# Altium footprint library LimeMicroAltiumLib_pcbLib.PcbLib: 223 footprints (part 14 of 15)
Each footprint in its own frame and in the unit in brackets; x right, y up, seen from the top. Pads: shape width x height; smd on the part's side, far side on the other; paste and mask are expansions set on the pad; w line width, h text height; cw(c..) or ccw(c..) is an arc to the next point about the centre after c.
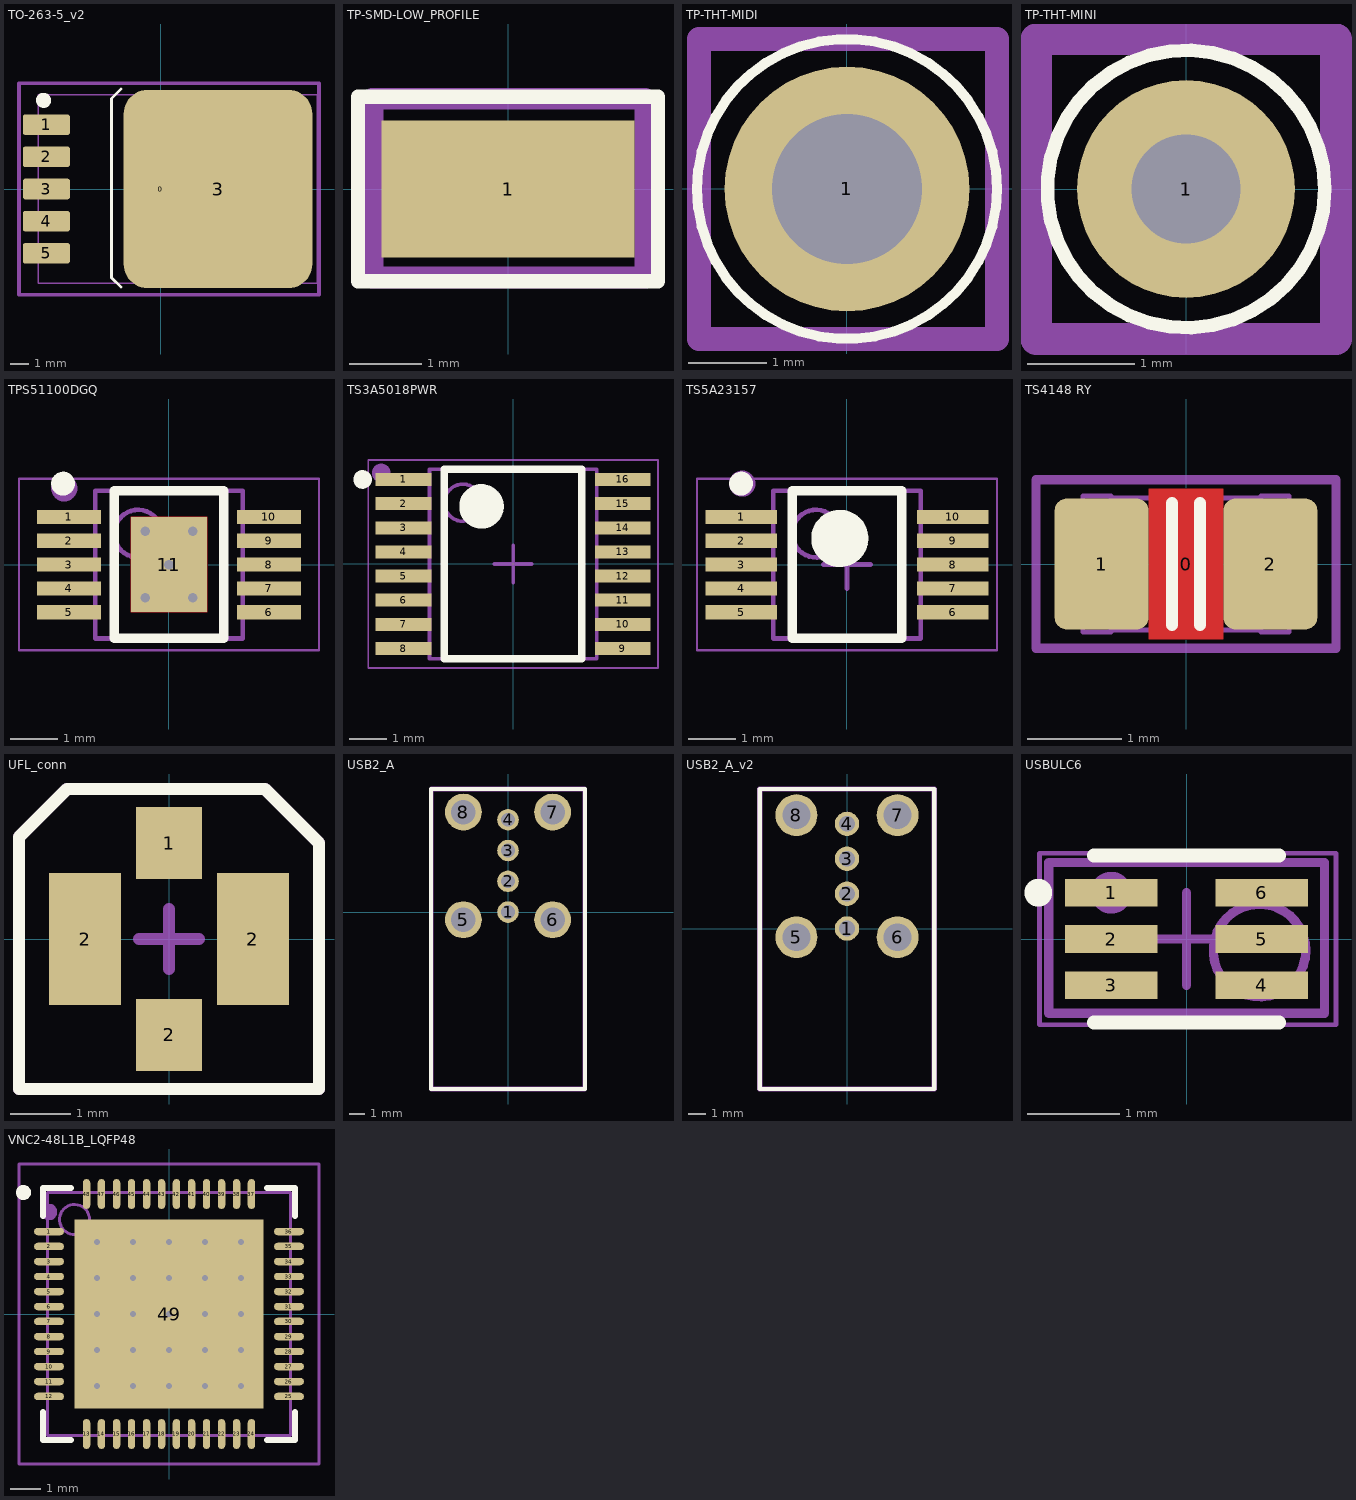
[diagram p13: the footprints below, top view; thin cyan lines are the x and y axes]

## TO-263-5_v2 [mm] "D-PAK/TO-263-5; 5 Leads; Body 14.4 (inc. leads) x 10.4 mm (LxW max)"
height 4.65
pads (7):
  round 0.5 on Mech15: 0(0,0)
  rrect25% 2.5x1.1 smd: 1(-6.05,3.41) 2(-6.05,1.705) 3(-6.05,0) 4(-6.05,-1.705) 5(-6.05,-3.41)
  rrect25% 10x10.5 smd: 3(3.05,0)
Top Overlay:
  circle w0.4: c-6.2,4.7 r0.2
  lines w0.15: -2.1,-5.2 -2.6,-4.7 -2.6,4.8 -2.1,5.3
Mechanical 13:
  lines w0.076: -6.49,-5 8.3,-5 8.3,5 -6.49,5 -6.49,-5
Mechanical 15:
  circle w0.4: c-6.2,3.4 r0.2
  lines w0.2: -7.5,-5.6 8.4,-5.6 8.4,5.6 -7.5,5.6 -7.5,-5.6
  text ".designator" at 0,0 h0.9
3D body "TO-263-5.stp": height 4.56, standoff 0, extent -6.727,-5.08 7.288,5.08

## TP-SMD-LOW_PROFILE [mm] "SMD test point loop"
height 4.6
pads (1):
  rect 3.5x1.9 smd: 1(0,0)
Top Overlay:
  lines w0.2: -2.075,-1.275 -2.075,1.275 2.075,1.275 2.075,-1.275 -2.075,-1.275
Mechanical 13:
  circle w0.076: c0,0 r0.76
Mechanical 15:
  lines w0.3: -1.875,-1.225 -1.875,1.25 1.9,1.25 1.9,-1.225 -1.875,-1.225
  text ".Designator" at 0,0 h0.7
3D body "RCW (1206).stp": height 2, standoff 0, extent -1.6,-0.8 1.6,0.8

## TP-THT-MIDI [mm] "Thru-hole test point loop"
height 4.6
pads (1):
  round 3.1 hole 1.9: 1(0,0)
Top Overlay:
  circle w0.127: c0,0 r1.9
Mechanical 13:
  circle w0.076: c0,0 r0.76
Mechanical 15:
  lines w0.3: -1.875,-1.9 1.9,-1.9 1.9,1.9 -1.875,1.9 -1.875,-1.9
  text ".Designator" at 0,0 h0.7
3D body "TestPoint_Multi.stp": height 8.09, standoff -3.21, extent -1.597,-1.6 1.597,1.587

## TP-THT-MINI [mil] "Thru-hole test point loop"
height 181.1
pads (1):
  round 80 / inner round 80 / far side round 90 hole 40: 1(0,0)
Top Overlay:
  circle w5: c0,0 r51
Mechanical 13:
  circle w3: c0,0 r29.94
Mechanical 15:
  lines w11.81: -55.12,-55.12 55.12,-55.12 55.12,55.12 -55.12,55.12 -55.12,-55.12
  text ".Designator" at 0,0 h27.56
3D body "TestPoint_Mini.stp": height 180.51, standoff -118.14, extent -48.82,-49.11 49.21,49.12

## TPS51100DGQ [mm] "TSSOP, 10-Leads, Body 3,00x3,00mm, Pitch 0,50mm, IPC Medium Density"
height 1.1
pads (11):
  rect 1.35x0.3 smd: 1(-2.1,1) 2(-2.1,0.5) 3(-2.1,0) 4(-2.1,-0.5) 5(-2.1,-1) 6(2.1,-1) 7(2.1,-0.5) 8(2.1,0) 9(2.1,0.5) 10(2.1,1)
  rect 1.6x2 smd: 11(0,0)
via -0.5,0.7 diameter 0.4 hole 0.2
via 0.5,0.7 diameter 0.4 hole 0.2
via 0.5,-0.7 diameter 0.4 hole 0.2
via -0.5,-0.7 diameter 0.4 hole 0.2
via 0,0 diameter 0.4 hole 0.2
Top Layer:
  region: -0.8,-1 0.8,-1 0.8,1 -0.8,1
Top Overlay:
  circle w0.25: c-2.225,1.7 r0.125
  lines w0.2: -1.15,-1.55 1.15,-1.55 1.15,1.55 -1.15,1.55 -1.15,-1.55
Mechanical 13:
  circle w0.1: c-0.65,0.65 r0.5
  lines w0.1: -1.55,-1.55 1.55,-1.55 1.55,1.55 -1.55,1.55 -1.55,-1.55
Mechanical 15:
  circle w0.35: c-2.2,1.6 r0.1
  lines w0.05: -3.15,-1.8 3.15,-1.8 3.15,1.8 -3.15,1.8 -3.15,-1.8
  lines w0.1: -0.5,0 0.5,0 ; 0,-0.5 0,0.5
  text ".Designator" at 0,0 h0.7
3D body "User Library-MSOP-10-1.step": height 1.05, standoff 0, extent -2.514,-1.5 2.514,1.5

## TS3A5018PWR [mm] "TSOP, 16-Leads, Body 5,00x4,40mm, Pitch 0,65mm, IPC Medium Density"
height 1.2
pads (16):
  rect 1.5x0.35 smd: 1(-2.95,2.275) 2(-2.95,1.625) 3(-2.95,0.975) 4(-2.95,0.325) 5(-2.95,-0.325) 6(-2.95,-0.975) 7(-2.95,-1.625) 8(-2.95,-2.275) 9(2.95,-2.275) 10(2.95,-1.625) 11(2.95,-0.975) 12(2.95,-0.325) 13(2.95,0.325) 14(2.95,0.975) 15(2.95,1.625) 16(2.95,2.275)
Top Overlay:
  circle w0.6: c-0.85,1.55 r0.3
  circle w0.25: c-4.05,2.275 r0.125
  lines w0.2: -1.85,-2.55 1.85,-2.55 1.85,2.55 -1.85,2.55 -1.85,-2.55
Mechanical 13:
  circle w0.1: c-1.35,1.65 r0.5
  lines w0.1: -2.25,-2.55 2.25,-2.55 2.25,2.55 -2.25,2.55 -2.25,-2.55
Mechanical 15:
  circle w0.35: c-3.55,2.45 r0.075
  lines w0.05: -3.9,-2.8 3.9,-2.8 3.9,2.8 -3.9,2.8 -3.9,-2.8
  lines w0.1: -0.5,0 0.5,0 ; 0,-0.5 0,0.5
  text ".Designator" at 0,0 h0.7
3D body "User Library-TSSOP-16-1.step": height 1.1, standoff 0, extent -3.2,-2.5 3.2,2.5

## TS5A23157 [mm] "TSSOP, 10-Leads, Body 3,00x3,00mm, Pitch 0,50mm, IPC Medium Density"
height 1.1
pads (10):
  rect 1.5x0.3 smd mask+0.05: 1(-2.225,1) 2(-2.225,0.5) 3(-2.225,0) 4(-2.225,-0.5) 5(-2.225,-1) 6(2.225,-1) 7(2.225,-0.5) 8(2.225,0) 9(2.225,0.5) 10(2.225,1)
Top Overlay:
  circle w0.25: c-2.225,1.7 r0.125
  circle w0.6: c-0.15,0.55 r0.3
  lines w0.2: -1.15,-1.55 -1.15,1.55 1.15,1.55 1.15,-1.55 -1.15,-1.55
Mechanical 13:
  circle w0.1: c-0.65,0.65 r0.5
  lines w0.1: -1.55,-1.55 -1.55,1.55 1.55,1.55 1.55,-1.55 -1.55,-1.55
Mechanical 15:
  circle w0.35: c-2.2,1.7 r0.1
  lines w0.05: -3.15,-1.8 -3.15,1.8 3.15,1.8 3.15,-1.8 -3.15,-1.8
  lines w0.1: -0.5,0 0.5,0 ; 0,-0.5 0,0.5
  text ".Designator" at 0,0 h0.7
3D body "User Library-MSOP-10-1.step": height 1.05, standoff 0, extent -2.514,-1.5 2.514,1.5
3D body: height 1.1, standoff 0.1, extent -1.55,-1.55 1.55,1.55

## TS4148 RY [mm] "Chip Capacitor, Body 2.0x1.2mm, 0805, IPC Medium Density"
height 1.2
pads (3):
  round 0.254 on Mech15: 0(0,0)
  rrect25% 1x1.4 smd: 1(-0.9,0) 2(0.9,0)
Top Layer:
  pour cut-out: -0.4,0.8 0.4,0.8 0.4,-0.8 -0.4,-0.8
Top Overlay:
  lines w0.127: -0.15,-0.651 -0.15,0.651 ; 0.15,-0.651 0.15,0.651
Mechanical 13:
  lines w0.05: -0.8,-0.705 0.8,-0.705 ; -0.8,0.705 0.8,0.705 ; -1.1,-0.725 -1.1,0.725 -0.8,0.725 -0.8,-0.725 -1.1,-0.725 ; 0.8,-0.725 1.1,-0.725 1.1,0.725 0.8,0.725 0.8,-0.725
Mechanical 15:
  lines w0.1: -1.6,-0.9 -1.6,0.9 1.6,0.9 1.6,-0.9 -1.6,-0.9
  text ".Designator" at 0,0 h0.7
3D body "CAP_0805.STEP": height 1.34, standoff -0.01, extent -1.1,-0.725 1.1,0.725

## UFL_conn [mm]
pads (4):
  rect 1.1x1.2 smd: 1(0,1.6) 2(0,-1.6)
  rect 1.2x2.2 smd: 2(-1.4,0) 2(1.4,0)
Top Overlay:
  lines w0.2: -2.5,-2.5 2.5,-2.5 2.5,1.6 1.6,2.5 -1.7,2.5 -2.5,1.7 -2.5,-2.5
Mechanical 15:
  lines w0.2: -0.5,0 0.5,0 ; 0,-0.5 0,0.5 ; -2.5,-2.5 -2.5,1.7 -1.7,2.5 1.6,2.5 2.5,1.6 2.5,-2.5 -2.5,-2.5
  text ".designator" at 0,0 h0.9
  text "in" at -0.7,1.3 h0.9
3D body "User Library-U_FL-R-SMT-1.step": height 1.25, standoff -0.01, extent -1.55,-1.5 1.55,1.5

## USB2_A [mm]
pads (8):
  round 1.4 hole 0.9: 1(0,0) 2(0,2) 3(0,4) 4(0,6)
  round 2.4 hole 1.6: 5(-2.9,-0.5) 6(2.9,-0.5) 7(2.9,6.5) 8(-2.9,6.5)
Top Overlay:
  lines w0.254: -5,-11.5 -5,8 5,8 5,-11.5 -5,-11.5
Mechanical 15:
  lines w0.3: -5,-11.5 -5,8 5,8 5,-11.5 -5,-11.5
  text ".Designator" at 0,0 h0.7

## USB2_A_v2 [mm]
pads (8):
  round 1.4 hole 0.9: 1(0,0) 2(0,2) 3(0,4) 4(0,6)
  round 2.4 hole 1.6: 5(-2.9,-0.5) 6(2.9,-0.5) 7(2.9,6.5) 8(-2.9,6.5)
Top Overlay:
  lines w0.254: -5,-9.2 5,-9.2 5,8 -5,8 -5,-9.2
Mechanical 15:
  lines w0.3: -5,-9.2 -5,8 5,8 5,-9.2 -5,-9.2
  text ".Designator" at 0,0 h0.7

## USBULC6 [mm]
height 1.2
pads (6):
  rect 1x0.3 smd mask+0.07: 1(-0.812,0.5) 2(-0.812,0) 3(-0.812,-0.5) 4(0.813,-0.5) 5(0.813,0) 6(0.813,0.5)
Top Overlay:
  circle w0.25: c-1.6,0.5 r0.025
  lines w0.15: -1,-0.9 1,-0.9 ; -1,0.9 1,0.9
Mechanical 13:
  circle w0.1: c0.788,-0.125 r0.5
  lines w0.1: -1.487,-0.8 -1.487,0.825 1.488,0.825 1.488,-0.8 -1.487,-0.8
Mechanical 15:
  circle w0.35: c-0.812,0.5 r0.05
  lines w0.05: -1.587,-0.925 -1.587,0.925 1.613,0.925 1.613,-0.925 -1.587,-0.925
  lines w0.1: -0.5,0 0.5,0 ; 0,-0.5 0,0.5
  text ".Designator" at 0,0 h0.7
3D body: height 1.5, standoff 0, extent -0.825,-0.5 0.825,0.5

## uSpark_BODY1_MECH [mm]
3D body "User Library-SMA Antenna.step": height 81.97, standoff -5, extent 52.5,17.65 83.4,27.65
3D body "User Library-SMA Antenna.step": height 81.97, standoff -5, extent 52.475,3.325 83.375,13.325
3D body "User Library-SMA Antenna.step": height 81.97, standoff -5, extent 52.475,-24.75 83.375,-14.75
3D body "User Library-SMA Antenna.step": height 81.97, standoff -5, extent 52.475,-10.425 83.375,-0.425
3D body "1455A1202.stp": height 4.37, standoff -7.63, extent -73.5,-33.291 52.5,36.711

## uSpark_BODY_MECH [mm]
3D body "User Library-SMA Antenna.step": height 86.97, standoff 0, extent 52.475,-10.425 83.375,-0.425
3D body "User Library-SMA Antenna.step": height 86.97, standoff 0, extent 52.475,-24.75 83.375,-14.75
3D body "User Library-SMA Antenna.step": height 86.97, standoff 0, extent 52.475,3.325 83.375,13.325
3D body "User Library-SMA Antenna.step": height 86.97, standoff 0, extent 52.5,17.65 83.4,27.65
3D body "1455A1002.stp": height 9.37, standoff -2.63, extent -53.525,-34.611 52.475,35.391

## uSpark_BODY_PANEL_MECH [mm]
3D body: height 6, standoff 0, extent 50,-26 51.5,29
3D body "User Library-SMA-2.step": height 8.25, standoff -2.25, extent 23.85,-25.025 58.85,-14.525
3D body "User Library-SMA-2.step": height 8.25, standoff -2.25, extent 23.85,-10.7 58.85,-0.2
3D body "User Library-SMA-2.step": height 8.25, standoff -2.25, extent 23.85,3.05 58.85,13.55
3D body "User Library-SMA-2.step": height 8.25, standoff -2.25, extent 23.875,17.375 58.875,27.875
3D body "User Library-SMA Antenna.step": height 84.97, standoff -2, extent 52.475,-10.425 83.375,-0.425
3D body "User Library-SMA Antenna.step": height 84.97, standoff -2, extent 52.475,-24.75 83.375,-14.75
3D body "User Library-SMA Antenna.step": height 84.97, standoff -2, extent 52.475,3.325 83.375,13.325
3D body "User Library-SMA Antenna.step": height 84.97, standoff -2, extent 52.5,17.65 83.4,27.65

## VNC2-48L1B_LQFP48 [mm] "VNC2-48L1B chip with LQFP-48 package"
pads (49):
  oval 1x0.25 smd: 1(-4,2.75) 2(-4,2.25) 3(-4,1.75) 4(-4,1.25) 5(-4,0.75) 6(-4,0.25) 7(-4,-0.25) 8(-4,-0.75) 9(-4,-1.25) 10(-4,-1.75) 11(-4,-2.25) 12(-4,-2.75) 25(4,-2.75) 26(4,-2.25) 27(4,-1.75) 28(4,-1.25) 29(4,-0.75) 30(4,-0.25) 31(4,0.25) 32(4,0.75) 33(4,1.25) 34(4,1.75) 35(4,2.25) 36(4,2.75)
  oval 0.25x1 smd: 13(-2.75,-4) 14(-2.25,-4) 15(-1.75,-4) 16(-1.25,-4) 17(-0.75,-4) 18(-0.25,-4) 19(0.25,-4) 20(0.75,-4) 21(1.25,-4) 22(1.75,-4) 23(2.25,-4) 24(2.75,-4) 37(2.75,4) 38(2.25,4) 39(1.75,4) 40(1.25,4) 41(0.75,4) 42(0.25,4) 43(-0.25,4) 44(-0.75,4) 45(-1.25,4) 46(-1.75,4) 47(-2.25,4) 48(-2.75,4)
  rect 6.3x6.3 smd: 49(0,0)
via 2.4,-2.4 diameter 0.4 hole 0.2
via 1.2,-2.4 diameter 0.4 hole 0.2
via 0,-2.4 diameter 0.4 hole 0.2
via -1.2,-2.4 diameter 0.4 hole 0.2
via -2.4,-2.4 diameter 0.4 hole 0.2
via 2.4,-1.2 diameter 0.4 hole 0.2
via 1.2,-1.2 diameter 0.4 hole 0.2
via 0,-1.2 diameter 0.4 hole 0.2
via -1.2,-1.2 diameter 0.4 hole 0.2
via -2.4,-1.2 diameter 0.4 hole 0.2
via 2.4,0 diameter 0.4 hole 0.2
via 1.2,0 diameter 0.4 hole 0.2
via 0,0 diameter 0.4 hole 0.2
via -1.2,0 diameter 0.4 hole 0.2
via -2.4,0 diameter 0.4 hole 0.2
via 2.4,1.2 diameter 0.4 hole 0.2
via 1.2,1.2 diameter 0.4 hole 0.2
via 0,1.2 diameter 0.4 hole 0.2
via -1.2,1.2 diameter 0.4 hole 0.2
via -2.4,1.2 diameter 0.4 hole 0.2
via 2.4,2.4 diameter 0.4 hole 0.2
via 1.2,2.4 diameter 0.4 hole 0.2
via 0,2.4 diameter 0.4 hole 0.2
via -1.2,2.4 diameter 0.4 hole 0.2
via -2.4,2.4 diameter 0.4 hole 0.2
Top Overlay:
  circle w0.25: c-4.85,4.05 r0.125
  lines w0.2: -4.2,-3.275 -4.2,-4.2 -3.275,-4.2 ; -4.2,3.275 -4.2,4.2 -3.275,4.2 ; 3.275,-4.2 4.2,-4.2 4.2,-3.275 ; 3.275,4.2 4.2,4.2 4.2,3.275
Mechanical 13:
  circle w0.1: c-3.15,3.15 r0.5
  lines w0.1: -4.05,-4.05 4.05,-4.05 4.05,4.05 -4.05,4.05 -4.05,-4.05
Mechanical 15:
  circle w0.35: c-4,3.4 r0.1
  lines w0.1: -0.5,0 0.5,0 ; 0,-0.5 0,0.5 ; -5,-5 5,-5 5,5 -5,5 -5,-5
  text ".Designator" at 0,0 h0.7
3D body: height 1, standoff 0, extent -4.05,-4.05 4.05,4.05